# Altium schematic symbol library jlcpcb_2025_04_resistors_extended_2512.schlib: 2667 symbols (part 11 of 14) (continued)
## RMC1-200JTE
designator R?  Resistance: 20Ω  (hidden comment: *)
Resistor, 20Ω, ±5%, 1W, 200V, ±200ppm/℃, -55℃~+155℃, SMD 2512; Manufacturer: Uniroyal; Manufacturer Part Number: RMC1-200JTE; Supplier 1: LCSC; Supplier Part Number 1: C909340; JLCPCB Part Number: C909340; Power Rating: 1W; Category: Resistors; Package Size: 2512; JLCPCB Basic Part: Yes; Tolerance: ±5%; Voltage Rating: 200V; Temperature Coefficient: ±200ppm/℃; Temperature Rating: -55℃~+155℃; ComponentLink1Description: Datasheet; ComponentLink1URL: https://wmsc.lcsc.com/wmsc/upload/file/pdf/v2/lcsc/2109151530_KAMAYA-RMC1-200JTE_C909340.pdf; ComponentLink2Description: JLCPCB Part URL; ComponentLink2URL: https://jlcpcb.com/partdetail/C909340
pins: 1, 2
1 alternate drawing of the same symbol

## RMC1-331JTE
designator R?  Resistance: 330Ω  (hidden comment: *)
Resistor, 330Ω, ±5%, 1W, ±200ppm/℃, SMD 2512; Manufacturer: Uniroyal; Manufacturer Part Number: RMC1-331JTE; Supplier 1: LCSC; Supplier Part Number 1: C323618; JLCPCB Part Number: C323618; Power Rating: 1W; Category: Resistors; Package Size: 2512; JLCPCB Basic Part: Yes; Tolerance: ±5%; Temperature Coefficient: ±200ppm/℃; ComponentLink1Description: Datasheet; ComponentLink1URL: https://wmsc.lcsc.com/wmsc/upload/file/pdf/v2/lcsc/2304140030_KAMAYA-RMC1-331JTE_C323618.pdf; ComponentLink2Description: JLCPCB Part URL; ComponentLink2URL: https://jlcpcb.com/partdetail/C323618
pins: 1, 2
1 alternate drawing of the same symbol

## RMC1-390JTE
designator R?  Resistance: 39Ω  (hidden comment: *)
Resistor, 39Ω, ±5%, 1W, ±200ppm/℃, -55℃~+155℃, SMD 2512; Manufacturer: Uniroyal; Manufacturer Part Number: RMC1-390JTE; Supplier 1: LCSC; Supplier Part Number 1: C323616; JLCPCB Part Number: C323616; Power Rating: 1W; Category: Resistors; Package Size: 2512; JLCPCB Basic Part: Yes; Tolerance: ±5%; Temperature Coefficient: ±200ppm/℃; Temperature Rating: -55℃~+155℃; ComponentLink1Description: Datasheet; ComponentLink1URL: https://wmsc.lcsc.com/wmsc/upload/file/pdf/v2/lcsc/2304140030_KAMAYA-RMC1-390JTE_C323616.pdf; ComponentLink2Description: JLCPCB Part URL; ComponentLink2URL: https://jlcpcb.com/partdetail/C323616
pins: 1, 2
1 alternate drawing of the same symbol

## RMC1-472JTE-M
designator R?  Resistance: 4.7kΩ  (hidden comment: *)
Resistor, 4.7kΩ, ±5%, 1W, ±200ppm/℃, SMD 2512; Manufacturer: Uniroyal; Manufacturer Part Number: RMC1-472JTE-M; Supplier 1: LCSC; Supplier Part Number 1: C340480; JLCPCB Part Number: C340480; Power Rating: 1W; Category: Resistors; Package Size: 2512; JLCPCB Basic Part: Yes; Tolerance: ±5%; Temperature Coefficient: ±200ppm/℃; ComponentLink1Description: Datasheet; ComponentLink1URL: https://wmsc.lcsc.com/wmsc/upload/file/pdf/v2/lcsc/2304140030_KAMAYA-RMC1-472JTE-M_C340480.pdf; ComponentLink2Description: JLCPCB Part URL; ComponentLink2URL: https://jlcpcb.com/partdetail/C340480
pins: 1, 2
1 alternate drawing of the same symbol

## RMC1K100FTE-M
designator R?  Resistance: 10Ω  (hidden comment: *)
Resistor, 10Ω, ±1%, 1W, ±100ppm/℃, SMD 2512; Manufacturer: Uniroyal; Manufacturer Part Number: RMC1K100FTE-M; Supplier 1: LCSC; Supplier Part Number 1: C340513; JLCPCB Part Number: C340513; Power Rating: 1W; Category: Resistors; Package Size: 2512; JLCPCB Basic Part: Yes; Tolerance: ±1%; Temperature Coefficient: ±100ppm/℃; ComponentLink1Description: Datasheet; ComponentLink1URL: https://wmsc.lcsc.com/wmsc/upload/file/pdf/v2/lcsc/2304140030_KAMAYA-RMC1K100FTE-M_C340513.pdf; ComponentLink2Description: JLCPCB Part URL; ComponentLink2URL: https://jlcpcb.com/partdetail/C340513
pins: 1, 2
1 alternate drawing of the same symbol

## RMC25121K1_N
designator R?  Resistance: 1kΩ  (hidden comment: *)
Resistor, 1kΩ, ±1%, 1W, SMD 2512; Manufacturer: Uniroyal; Manufacturer Part Number: RMC25121K1%N; Supplier 1: LCSC; Supplier Part Number 1: C269365; JLCPCB Part Number: C269365; Power Rating: 1W; Category: Resistors; Package Size: 2512; JLCPCB Basic Part: Yes; Tolerance: ±1%; ComponentLink1Description: Datasheet; ComponentLink1URL: https://wmsc.lcsc.com/wmsc/upload/file/pdf/v2/lcsc/2304140030_TyoHM-RMC25121K1-N_C269365.pdf; ComponentLink2Description: JLCPCB Part URL; ComponentLink2URL: https://jlcpcb.com/partdetail/C269365
pins: 1, 2
1 alternate drawing of the same symbol

## RMC25121K5_N
designator R?  Resistance: 1kΩ  (hidden comment: *)
Resistor, 1kΩ, ±5%, 1W, SMD 2512; Manufacturer: Uniroyal; Manufacturer Part Number: RMC25121K5%N; Supplier 1: LCSC; Supplier Part Number 1: C269349; JLCPCB Part Number: C269349; Power Rating: 1W; Category: Resistors; Package Size: 2512; JLCPCB Basic Part: Yes; Tolerance: ±5%; ComponentLink1Description: Datasheet; ComponentLink1URL: https://wmsc.lcsc.com/wmsc/upload/file/pdf/v2/lcsc/2304140030_TyoHM-RMC25121K5-N_C269349.pdf; ComponentLink2Description: JLCPCB Part URL; ComponentLink2URL: https://jlcpcb.com/partdetail/C269349
pins: 1, 2
1 alternate drawing of the same symbol

## RMC25121M1_N
designator R?  Resistance: 1MΩ  (hidden comment: *)
Resistor, 1MΩ, ±1%, 1W, SMD 2512; Manufacturer: Uniroyal; Manufacturer Part Number: RMC25121M1%N; Supplier 1: LCSC; Supplier Part Number 1: C269888; JLCPCB Part Number: C269888; Power Rating: 1W; Category: Resistors; Package Size: 2512; JLCPCB Basic Part: Yes; Tolerance: ±1%; ComponentLink1Description: Datasheet; ComponentLink1URL: https://wmsc.lcsc.com/wmsc/upload/file/pdf/v2/lcsc/2304140030_TyoHM-RMC25121M1-N_C269888.pdf; ComponentLink2Description: JLCPCB Part URL; ComponentLink2URL: https://jlcpcb.com/partdetail/C269888
pins: 1, 2
1 alternate drawing of the same symbol

## RMC25122_21_N
designator R?  Resistance: 2.2Ω  (hidden comment: *)
Resistor, 2.2Ω, ±1%, 1W, SMD 2512; Manufacturer: Uniroyal; Manufacturer Part Number: RMC25122.21%N; Supplier 1: LCSC; Supplier Part Number 1: C269371; JLCPCB Part Number: C269371; Power Rating: 1W; Category: Resistors; Package Size: 2512; JLCPCB Basic Part: Yes; Tolerance: ±1%; ComponentLink1Description: Datasheet; ComponentLink1URL: https://wmsc.lcsc.com/wmsc/upload/file/pdf/v2/lcsc/2304140030_TyoHM-RMC25122-21-N_C269371.pdf; ComponentLink2Description: JLCPCB Part URL; ComponentLink2URL: https://jlcpcb.com/partdetail/C269371
pins: 1, 2
1 alternate drawing of the same symbol

## RMC25122_25_N
designator R?  Resistance: 2.2Ω  (hidden comment: *)
Resistor, 2.2Ω, ±5%, 1W, SMD 2512; Manufacturer: Uniroyal; Manufacturer Part Number: RMC25122.25%N; Supplier 1: LCSC; Supplier Part Number 1: C269350; JLCPCB Part Number: C269350; Power Rating: 1W; Category: Resistors; Package Size: 2512; JLCPCB Basic Part: Yes; Tolerance: ±5%; ComponentLink1Description: Datasheet; ComponentLink1URL: https://wmsc.lcsc.com/wmsc/upload/file/pdf/v2/lcsc/2304140030_TyoHM-RMC25122-25-N_C269350.pdf; ComponentLink2Description: JLCPCB Part URL; ComponentLink2URL: https://jlcpcb.com/partdetail/C269350
pins: 1, 2
1 alternate drawing of the same symbol

## RMC25124_7K1_N
designator R?  Resistance: 4.7kΩ  (hidden comment: *)
Resistor, 4.7kΩ, ±1%, 1W, SMD 2512; Manufacturer: Uniroyal; Manufacturer Part Number: RMC25124.7K1%N; Supplier 1: LCSC; Supplier Part Number 1: C269368; JLCPCB Part Number: C269368; Power Rating: 1W; Category: Resistors; Package Size: 2512; JLCPCB Basic Part: Yes; Tolerance: ±1%; ComponentLink1Description: Datasheet; ComponentLink1URL: https://wmsc.lcsc.com/wmsc/upload/file/pdf/v2/lcsc/2304140030_TyoHM-RMC25124-7K1-N_C269368.pdf; ComponentLink2Description: JLCPCB Part URL; ComponentLink2URL: https://jlcpcb.com/partdetail/C269368
pins: 1, 2
1 alternate drawing of the same symbol

## RMC251205_N
designator R?  Resistance: 0Ω  (hidden comment: *)
Resistor, 0Ω, ±5%, 1W, SMD 2512; Manufacturer: Uniroyal; Manufacturer Part Number: RMC251205%N; Supplier 1: LCSC; Supplier Part Number 1: C269343; JLCPCB Part Number: C269343; Power Rating: 1W; Category: Resistors; Package Size: 2512; JLCPCB Basic Part: Yes; Tolerance: ±5%; ComponentLink1Description: Datasheet; ComponentLink1URL: https://wmsc.lcsc.com/wmsc/upload/file/pdf/v2/lcsc/2304140030_TyoHM-RMC251205-N_C269343.pdf; ComponentLink2Description: JLCPCB Part URL; ComponentLink2URL: https://jlcpcb.com/partdetail/C269343
pins: 1, 2
1 alternate drawing of the same symbol

## RMC251211_N
designator R?  Resistance: 1Ω  (hidden comment: *)
Resistor, 1Ω, ±1%, 1W, SMD 2512; Manufacturer: Uniroyal; Manufacturer Part Number: RMC251211%N; Supplier 1: LCSC; Supplier Part Number 1: C269370; JLCPCB Part Number: C269370; Power Rating: 1W; Category: Resistors; Package Size: 2512; JLCPCB Basic Part: Yes; Tolerance: ±1%; ComponentLink1Description: Datasheet; ComponentLink1URL: https://wmsc.lcsc.com/wmsc/upload/file/pdf/v2/lcsc/2304140030_TyoHM-RMC251211-N_C269370.pdf; ComponentLink2Description: JLCPCB Part URL; ComponentLink2URL: https://jlcpcb.com/partdetail/C269370
pins: 1, 2
1 alternate drawing of the same symbol

## RMC251220K5_N
designator R?  Resistance: 20kΩ  (hidden comment: *)
Resistor, 20kΩ, ±5%, 1W, SMD 2512; Manufacturer: Uniroyal; Manufacturer Part Number: RMC251220K5%N; Supplier 1: LCSC; Supplier Part Number 1: C269353; JLCPCB Part Number: C269353; Power Rating: 1W; Category: Resistors; Package Size: 2512; JLCPCB Basic Part: Yes; Tolerance: ±5%; ComponentLink1Description: Datasheet; ComponentLink1URL: https://wmsc.lcsc.com/wmsc/upload/file/pdf/v2/lcsc/2304140030_TyoHM-RMC251220K5-N_C269353.pdf; ComponentLink2Description: JLCPCB Part URL; ComponentLink2URL: https://jlcpcb.com/partdetail/C269353
pins: 1, 2
1 alternate drawing of the same symbol

## RMC251247K5_N
designator R?  Resistance: 47kΩ  (hidden comment: *)
Resistor, 47kΩ, ±5%, 1W, SMD 2512; Manufacturer: Uniroyal; Manufacturer Part Number: RMC251247K5%N; Supplier 1: LCSC; Supplier Part Number 1: C269358; JLCPCB Part Number: C269358; Power Rating: 1W; Category: Resistors; Package Size: 2512; JLCPCB Basic Part: Yes; Tolerance: ±5%; ComponentLink1Description: Datasheet; ComponentLink1URL: https://wmsc.lcsc.com/wmsc/upload/file/pdf/v2/lcsc/2304140030_TyoHM-RMC251247K5-N_C269358.pdf; ComponentLink2Description: JLCPCB Part URL; ComponentLink2URL: https://jlcpcb.com/partdetail/C269358
pins: 1, 2
1 alternate drawing of the same symbol

## RMC251256K1_N
designator R?  Resistance: 56kΩ  (hidden comment: *)
Resistor, 56kΩ, ±1%, 1W, SMD 2512; Manufacturer: Uniroyal; Manufacturer Part Number: RMC251256K1%N; Supplier 1: LCSC; Supplier Part Number 1: C269369; JLCPCB Part Number: C269369; Power Rating: 1W; Category: Resistors; Package Size: 2512; JLCPCB Basic Part: Yes; Tolerance: ±1%; ComponentLink1Description: Datasheet; ComponentLink1URL: https://wmsc.lcsc.com/wmsc/upload/file/pdf/v2/lcsc/2304140030_TyoHM-RMC251256K1-N_C269369.pdf; ComponentLink2Description: JLCPCB Part URL; ComponentLink2URL: https://jlcpcb.com/partdetail/C269369
pins: 1, 2
1 alternate drawing of the same symbol

## RMC2512105_N
designator R?  Resistance: 10Ω  (hidden comment: *)
Resistor, 10Ω, ±5%, 1W, SMD 2512; Manufacturer: Uniroyal; Manufacturer Part Number: RMC2512105%N; Supplier 1: LCSC; Supplier Part Number 1: C269345; JLCPCB Part Number: C269345; Power Rating: 1W; Category: Resistors; Package Size: 2512; JLCPCB Basic Part: Yes; Tolerance: ±5%; ComponentLink1Description: Datasheet; ComponentLink1URL: https://wmsc.lcsc.com/wmsc/upload/file/pdf/v2/lcsc/2304140030_TyoHM-RMC2512105-N_C269345.pdf; ComponentLink2Description: JLCPCB Part URL; ComponentLink2URL: https://jlcpcb.com/partdetail/C269345
pins: 1, 2
1 alternate drawing of the same symbol

## RMC2512240K5_N
designator R?  Resistance: 240kΩ  (hidden comment: *)
Resistor, 240kΩ, ±5%, 1W, SMD 2512; Manufacturer: Uniroyal; Manufacturer Part Number: RMC2512240K5%N; Supplier 1: LCSC; Supplier Part Number 1: C269355; JLCPCB Part Number: C269355; Power Rating: 1W; Category: Resistors; Package Size: 2512; JLCPCB Basic Part: Yes; Tolerance: ±5%; ComponentLink1Description: Datasheet; ComponentLink1URL: https://wmsc.lcsc.com/wmsc/upload/file/pdf/v2/lcsc/2304140030_TyoHM-RMC2512240K5-N_C269355.pdf; ComponentLink2Description: JLCPCB Part URL; ComponentLink2URL: https://jlcpcb.com/partdetail/C269355
pins: 1, 2
1 alternate drawing of the same symbol

## RMC2512300K1_N
designator R?  Resistance: 300kΩ  (hidden comment: *)
Resistor, 300kΩ, ±1%, 1W, SMD 2512; Manufacturer: Uniroyal; Manufacturer Part Number: RMC2512300K1%N; Supplier 1: LCSC; Supplier Part Number 1: C269366; JLCPCB Part Number: C269366; Power Rating: 1W; Category: Resistors; Package Size: 2512; JLCPCB Basic Part: Yes; Tolerance: ±1%; ComponentLink1Description: Datasheet; ComponentLink1URL: https://wmsc.lcsc.com/wmsc/upload/file/pdf/v2/lcsc/2304140030_TyoHM-RMC2512300K1-N_C269366.pdf; ComponentLink2Description: JLCPCB Part URL; ComponentLink2URL: https://jlcpcb.com/partdetail/C269366
pins: 1, 2
1 alternate drawing of the same symbol

## RMC2512365_N
designator R?  Resistance: 36Ω  (hidden comment: *)
Resistor, 36Ω, ±5%, 1W, SMD 2512; Manufacturer: Uniroyal; Manufacturer Part Number: RMC2512365%N; Supplier 1: LCSC; Supplier Part Number 1: C269357; JLCPCB Part Number: C269357; Power Rating: 1W; Category: Resistors; Package Size: 2512; JLCPCB Basic Part: Yes; Tolerance: ±5%; ComponentLink1Description: Datasheet; ComponentLink1URL: https://wmsc.lcsc.com/wmsc/upload/file/pdf/v2/lcsc/2304140030_TyoHM-RMC2512365-N_C269357.pdf; ComponentLink2Description: JLCPCB Part URL; ComponentLink2URL: https://jlcpcb.com/partdetail/C269357
pins: 1, 2
1 alternate drawing of the same symbol

## RMC2512475_N
designator R?  Resistance: 47Ω  (hidden comment: *)
Resistor, 47Ω, ±5%, 1W, SMD 2512; Manufacturer: Uniroyal; Manufacturer Part Number: RMC2512475%N; Supplier 1: LCSC; Supplier Part Number 1: C269359; JLCPCB Part Number: C269359; Power Rating: 1W; Category: Resistors; Package Size: 2512; JLCPCB Basic Part: Yes; Tolerance: ±5%; ComponentLink1Description: Datasheet; ComponentLink1URL: https://wmsc.lcsc.com/wmsc/upload/file/pdf/v2/lcsc/2304140030_TyoHM-RMC2512475-N_C269359.pdf; ComponentLink2Description: JLCPCB Part URL; ComponentLink2URL: https://jlcpcb.com/partdetail/C269359
pins: 1, 2
1 alternate drawing of the same symbol

## RMC2512510K5_N
designator R?  Resistance: 510kΩ  (hidden comment: *)
Resistor, 510kΩ, ±5%, 1W, SMD 2512; Manufacturer: Uniroyal; Manufacturer Part Number: RMC2512510K5%N; Supplier 1: LCSC; Supplier Part Number 1: C269360; JLCPCB Part Number: C269360; Power Rating: 1W; Category: Resistors; Package Size: 2512; JLCPCB Basic Part: Yes; Tolerance: ±5%; ComponentLink1Description: Datasheet; ComponentLink1URL: https://wmsc.lcsc.com/wmsc/upload/file/pdf/v2/lcsc/2304140030_TyoHM-RMC2512510K5-N_C269360.pdf; ComponentLink2Description: JLCPCB Part URL; ComponentLink2URL: https://jlcpcb.com/partdetail/C269360
pins: 1, 2
1 alternate drawing of the same symbol

## RMC25121001_N
designator R?  Resistance: 100Ω  (hidden comment: *)
Resistor, 100Ω, ±1%, 1W, SMD 2512; Manufacturer: Uniroyal; Manufacturer Part Number: RMC25121001%N; Supplier 1: LCSC; Supplier Part Number 1: C325952; JLCPCB Part Number: C325952; Power Rating: 1W; Category: Resistors; Package Size: 2512; JLCPCB Basic Part: Yes; Tolerance: ±1%; ComponentLink1Description: Datasheet; ComponentLink1URL: https://wmsc.lcsc.com/wmsc/upload/file/pdf/v2/lcsc/2304140030_TyoHM-RMC25121001-N_C325952.pdf; ComponentLink2Description: JLCPCB Part URL; ComponentLink2URL: https://jlcpcb.com/partdetail/C325952
pins: 1, 2
1 alternate drawing of the same symbol

## RMC25121005_N
designator R?  Resistance: 100Ω  (hidden comment: *)
Resistor, 100Ω, ±5%, 1W, SMD 2512; Manufacturer: Uniroyal; Manufacturer Part Number: RMC25121005%N; Supplier 1: LCSC; Supplier Part Number 1: C269344; JLCPCB Part Number: C269344; Power Rating: 1W; Category: Resistors; Package Size: 2512; JLCPCB Basic Part: Yes; Tolerance: ±5%; ComponentLink1Description: Datasheet; ComponentLink1URL: https://wmsc.lcsc.com/wmsc/upload/file/pdf/v2/lcsc/2304140030_TyoHM-RMC25121005-N_C269344.pdf; ComponentLink2Description: JLCPCB Part URL; ComponentLink2URL: https://jlcpcb.com/partdetail/C269344
pins: 1, 2
1 alternate drawing of the same symbol

## RMC25121505_N
designator R?  Resistance: 150Ω  (hidden comment: *)
Resistor, 150Ω, ±5%, 1W, SMD 2512; Manufacturer: Uniroyal; Manufacturer Part Number: RMC25121505%N; Supplier 1: LCSC; Supplier Part Number 1: C269348; JLCPCB Part Number: C269348; Power Rating: 1W; Category: Resistors; Package Size: 2512; JLCPCB Basic Part: Yes; Tolerance: ±5%; ComponentLink1Description: Datasheet; ComponentLink1URL: https://wmsc.lcsc.com/wmsc/upload/file/pdf/v2/lcsc/2304140030_TyoHM-RMC25121505-N_C269348.pdf; ComponentLink2Description: JLCPCB Part URL; ComponentLink2URL: https://jlcpcb.com/partdetail/C269348
pins: 1, 2
1 alternate drawing of the same symbol

## RMC25122005_N
designator R?  Resistance: 200Ω  (hidden comment: *)
Resistor, 200Ω, ±5%, 1W, SMD 2512; Manufacturer: Uniroyal; Manufacturer Part Number: RMC25122005%N; Supplier 1: LCSC; Supplier Part Number 1: C269352; JLCPCB Part Number: C269352; Power Rating: 1W; Category: Resistors; Package Size: 2512; JLCPCB Basic Part: Yes; Tolerance: ±5%; ComponentLink1Description: Datasheet; ComponentLink1URL: https://wmsc.lcsc.com/wmsc/upload/file/pdf/v2/lcsc/2304140030_TyoHM-RMC25122005-N_C269352.pdf; ComponentLink2Description: JLCPCB Part URL; ComponentLink2URL: https://jlcpcb.com/partdetail/C269352
pins: 1, 2
1 alternate drawing of the same symbol

## RMC25122205_N
designator R?  Resistance: 220Ω  (hidden comment: *)
Resistor, 220Ω, ±5%, 1W, SMD 2512; Manufacturer: Uniroyal; Manufacturer Part Number: RMC25122205%N; Supplier 1: LCSC; Supplier Part Number 1: C269354; JLCPCB Part Number: C269354; Power Rating: 1W; Category: Resistors; Package Size: 2512; JLCPCB Basic Part: Yes; Tolerance: ±5%; ComponentLink1Description: Datasheet; ComponentLink1URL: https://wmsc.lcsc.com/wmsc/upload/file/pdf/v2/lcsc/2304140030_TyoHM-RMC25122205-N_C269354.pdf; ComponentLink2Description: JLCPCB Part URL; ComponentLink2URL: https://jlcpcb.com/partdetail/C269354
pins: 1, 2
1 alternate drawing of the same symbol

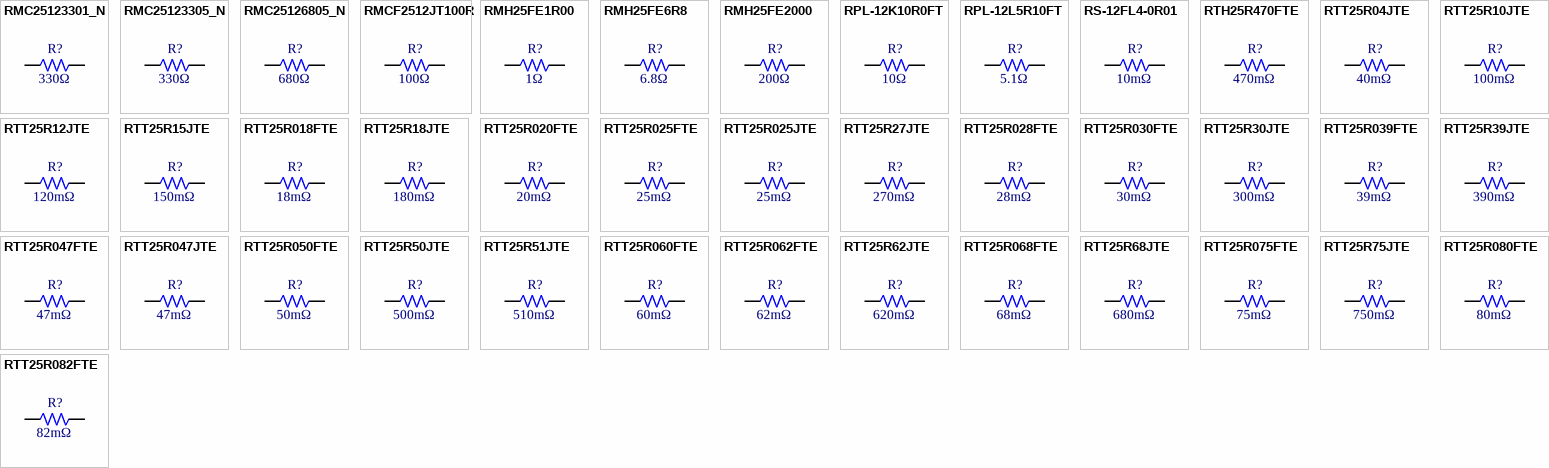
[diagram p53: symbols RMC25123301_N to RTT25R082FTE]

## RMC25123301_N
designator R?  Resistance: 330Ω  (hidden comment: *)
Resistor, 330Ω, ±1%, 1W, SMD 2512; Manufacturer: Uniroyal; Manufacturer Part Number: RMC25123301%N; Supplier 1: LCSC; Supplier Part Number 1: C269367; JLCPCB Part Number: C269367; Power Rating: 1W; Category: Resistors; Package Size: 2512; JLCPCB Basic Part: Yes; Tolerance: ±1%; ComponentLink1Description: Datasheet; ComponentLink1URL: https://wmsc.lcsc.com/wmsc/upload/file/pdf/v2/lcsc/2304140030_TyoHM-RMC25123301-N_C269367.pdf; ComponentLink2Description: JLCPCB Part URL; ComponentLink2URL: https://jlcpcb.com/partdetail/C269367
pins: 1, 2
1 alternate drawing of the same symbol

## RMC25123305_N
designator R?  Resistance: 330Ω  (hidden comment: *)
Resistor, 330Ω, ±5%, 1W, SMD 2512; Manufacturer: Uniroyal; Manufacturer Part Number: RMC25123305%N; Supplier 1: LCSC; Supplier Part Number 1: C269356; JLCPCB Part Number: C269356; Power Rating: 1W; Category: Resistors; Package Size: 2512; JLCPCB Basic Part: Yes; Tolerance: ±5%; ComponentLink1Description: Datasheet; ComponentLink1URL: https://wmsc.lcsc.com/wmsc/upload/file/pdf/v2/lcsc/2304140030_TyoHM-RMC25123305-N_C269356.pdf; ComponentLink2Description: JLCPCB Part URL; ComponentLink2URL: https://jlcpcb.com/partdetail/C269356
pins: 1, 2
1 alternate drawing of the same symbol

## RMC25126805_N
designator R?  Resistance: 680Ω  (hidden comment: *)
Resistor, 680Ω, ±5%, 1W, SMD 2512; Manufacturer: Uniroyal; Manufacturer Part Number: RMC25126805%N; Supplier 1: LCSC; Supplier Part Number 1: C269363; JLCPCB Part Number: C269363; Power Rating: 1W; Category: Resistors; Package Size: 2512; JLCPCB Basic Part: Yes; Tolerance: ±5%; ComponentLink1Description: Datasheet; ComponentLink1URL: https://wmsc.lcsc.com/wmsc/upload/file/pdf/v2/lcsc/2304140030_TyoHM-RMC25126805-N_C269363.pdf; ComponentLink2Description: JLCPCB Part URL; ComponentLink2URL: https://jlcpcb.com/partdetail/C269363
pins: 1, 2
1 alternate drawing of the same symbol

## RMCF2512JT100R
designator R?  Resistance: 100Ω  (hidden comment: *)
Resistor, 100Ω, ±5%, 1W, 200V, ±200ppm/℃, -55℃~+155℃, SMD 2512; Manufacturer: Uniroyal; Manufacturer Part Number: RMCF2512JT100R; Supplier 1: LCSC; Supplier Part Number 1: C2441438; JLCPCB Part Number: C2441438; Power Rating: 1W; Category: Resistors; Package Size: 2512; JLCPCB Basic Part: Yes; Tolerance: ±5%; Voltage Rating: 200V; Temperature Coefficient: ±200ppm/℃; Temperature Rating: -55℃~+155℃; ComponentLink1Description: Datasheet; ComponentLink1URL: https://wmsc.lcsc.com/wmsc/upload/file/pdf/v2/lcsc/2304140030_SEI-Stackpole-Elec-RMCF2512JT100R_C2441438.pdf; ComponentLink2Description: JLCPCB Part URL; ComponentLink2URL: https://jlcpcb.com/partdetail/C2441438
pins: 1, 2
1 alternate drawing of the same symbol

## RMH25FE1R00
designator R?  Resistance: 1Ω  (hidden comment: *)
Resistor, 1Ω, ±1%, 2W, 200V, ±400ppm/℃, -55℃~+155℃, SMD 2512; Manufacturer: Uniroyal; Manufacturer Part Number: RMH25FE1R00; Supplier 1: LCSC; Supplier Part Number 1: C2941595; JLCPCB Part Number: C2941595; Power Rating: 2W; Category: Resistors; Package Size: 2512; JLCPCB Basic Part: Yes; Tolerance: ±1%; Voltage Rating: 200V; Temperature Coefficient: ±400ppm/℃; Temperature Rating: -55℃~+155℃; ComponentLink1Description: Datasheet; ComponentLink1URL: https://wmsc.lcsc.com/wmsc/upload/file/pdf/v2/lcsc/2201121900_TA-I-Tech-RMH25FE1R00_C2941595.pdf; ComponentLink2Description: JLCPCB Part URL; ComponentLink2URL: https://jlcpcb.com/partdetail/C2941595
pins: 1, 2
1 alternate drawing of the same symbol

## RMH25FE6R8
designator R?  Resistance: 6.8Ω  (hidden comment: *)
Resistor, 6.8Ω, ±1%, 2W, 200V, ±400ppm/℃, -55℃~+155℃, SMD 2512; Manufacturer: Uniroyal; Manufacturer Part Number: RMH25FE6R8; Supplier 1: LCSC; Supplier Part Number 1: C2941596; JLCPCB Part Number: C2941596; Power Rating: 2W; Category: Resistors; Package Size: 2512; JLCPCB Basic Part: Yes; Tolerance: ±1%; Voltage Rating: 200V; Temperature Coefficient: ±400ppm/℃; Temperature Rating: -55℃~+155℃; ComponentLink1Description: Datasheet; ComponentLink1URL: https://wmsc.lcsc.com/wmsc/upload/file/pdf/v2/lcsc/2201121900_TA-I-Tech-RMH25FE6R8_C2941596.pdf; ComponentLink2Description: JLCPCB Part URL; ComponentLink2URL: https://jlcpcb.com/partdetail/C2941596
pins: 1, 2
1 alternate drawing of the same symbol

## RMH25FE2000
designator R?  Resistance: 200Ω  (hidden comment: *)
Resistor, 200Ω, ±1%, 2W, 200V, ±100ppm/℃, -55℃~+155℃, SMD 2512; Manufacturer: Uniroyal; Manufacturer Part Number: RMH25FE2000; Supplier 1: LCSC; Supplier Part Number 1: C2941599; JLCPCB Part Number: C2941599; Power Rating: 2W; Category: Resistors; Package Size: 2512; JLCPCB Basic Part: Yes; Tolerance: ±1%; Voltage Rating: 200V; Temperature Coefficient: ±100ppm/℃; Temperature Rating: -55℃~+155℃; ComponentLink1Description: Datasheet; ComponentLink1URL: https://wmsc.lcsc.com/wmsc/upload/file/pdf/v2/lcsc/2201121900_TA-I-Tech-RMH25FE2000_C2941599.pdf; ComponentLink2Description: JLCPCB Part URL; ComponentLink2URL: https://jlcpcb.com/partdetail/C2941599
pins: 1, 2
1 alternate drawing of the same symbol

## RPL-12K10R0FT
designator R?  Resistance: 10Ω  (hidden comment: *)
Resistor, 10Ω, ±1%, 2W, ±100ppm/℃, -55℃~+155℃, SMD 2512; Manufacturer: Uniroyal; Manufacturer Part Number: RPL-12K10R0FT; Supplier 1: LCSC; Supplier Part Number 1: C2991665; JLCPCB Part Number: C2991665; Power Rating: 2W; Category: Resistors; Package Size: 2512; JLCPCB Basic Part: Yes; Tolerance: ±1%; Temperature Coefficient: ±100ppm/℃; Temperature Rating: -55℃~+155℃; ComponentLink1Description: Datasheet; ComponentLink1URL: https://wmsc.lcsc.com/wmsc/upload/file/pdf/v2/lcsc/2204111630_FH--Guangdong-Fenghua-Advanced-Tech-RPL-12K10R0FT_C2991665.pdf; ComponentLink2Description: JLCPCB Part URL; ComponentLink2URL: https://jlcpcb.com/partdetail/C2991665
pins: 1, 2
1 alternate drawing of the same symbol

## RPL-12L5R10FT
designator R?  Resistance: 5.1Ω  (hidden comment: *)
Resistor, 5.1Ω, ±1%, 2W, ±250ppm/℃, SMD 2512; Manufacturer: Uniroyal; Manufacturer Part Number: RPL-12L5R10FT; Supplier 1: LCSC; Supplier Part Number 1: C5119989; JLCPCB Part Number: C5119989; Power Rating: 2W; Category: Resistors; Package Size: 2512; JLCPCB Basic Part: Yes; Tolerance: ±1%; Temperature Coefficient: ±250ppm/℃; ComponentLink1Description: Datasheet; ComponentLink1URL: https://wmsc.lcsc.com/wmsc/upload/file/pdf/v2/lcsc/2207251030_FH--Guangdong-Fenghua-Advanced-Tech-RPL-12L5R10FT_C5119989.pdf; ComponentLink2Description: JLCPCB Part URL; ComponentLink2URL: https://jlcpcb.com/partdetail/C5119989
pins: 1, 2
1 alternate drawing of the same symbol

## RS-12FL4-0R01
designator R?  Resistance: 10mΩ  (hidden comment: *)
Resistor, 10mΩ, ±1%, SMD 2512; Manufacturer: Uniroyal; Manufacturer Part Number: RS-12FL4-0R01; Supplier 1: LCSC; Supplier Part Number 1: C2920591; JLCPCB Part Number: C2920591; Category: Resistors; Package Size: 2512; JLCPCB Basic Part: Yes; Tolerance: ±1%; ComponentLink1Description: Datasheet; ComponentLink1URL: https://wmsc.lcsc.com/wmsc/upload/file/pdf/v2/lcsc/2111152030_Viking-Tech-RS-12FL4-0R01_C2920591.pdf; ComponentLink2Description: JLCPCB Part URL; ComponentLink2URL: https://jlcpcb.com/partdetail/C2920591
pins: 1, 2
1 alternate drawing of the same symbol

## RTH25R470FTE
designator R?  Resistance: 470mΩ  (hidden comment: *)
Resistor, 470mΩ, ±1%, 2W, 200V, ±100ppm/℃, -55℃~+155℃, SMD 2512; Manufacturer: Uniroyal; Manufacturer Part Number: RTH25R470FTE; Supplier 1: LCSC; Supplier Part Number 1: C2991287; JLCPCB Part Number: C2991287; Power Rating: 2W; Category: Resistors; Package Size: 2512; JLCPCB Basic Part: Yes; Tolerance: ±1%; Voltage Rating: 200V; Temperature Coefficient: ±100ppm/℃; Temperature Rating: -55℃~+155℃; ComponentLink1Description: Datasheet; ComponentLink1URL: https://wmsc.lcsc.com/wmsc/upload/file/pdf/v2/lcsc/2204082030_RALEC-RTH25R470FTE_C2991287.pdf; ComponentLink2Description: JLCPCB Part URL; ComponentLink2URL: https://jlcpcb.com/partdetail/C2991287
pins: 1, 2
1 alternate drawing of the same symbol

## RTT25R04JTE
designator R?  Resistance: 40mΩ  (hidden comment: *)
Resistor, 40mΩ, ±5%, 1W, 200V, ±900ppm/℃, -55℃~+155℃, SMD 2512; Manufacturer: Uniroyal; Manufacturer Part Number: RTT25R04JTE; Supplier 1: LCSC; Supplier Part Number 1: C159169; JLCPCB Part Number: C159169; Power Rating: 1W; Category: Resistors; Package Size: 2512; JLCPCB Basic Part: Yes; Tolerance: ±5%; Voltage Rating: 200V; Temperature Coefficient: ±900ppm/℃; Temperature Rating: -55℃~+155℃; ComponentLink1Description: Datasheet; ComponentLink1URL: https://wmsc.lcsc.com/wmsc/upload/file/pdf/v2/lcsc/2304140030_RALEC-RTT25R04JTE_C159169.pdf; ComponentLink2Description: JLCPCB Part URL; ComponentLink2URL: https://jlcpcb.com/partdetail/C159169
pins: 1, 2
1 alternate drawing of the same symbol

## RTT25R10JTE
designator R?  Resistance: 100mΩ  (hidden comment: *)
Resistor, 100mΩ, ±5%, 1W, 200V, ±200ppm/℃, -55℃~+155℃, SMD 2512; Manufacturer: Uniroyal; Manufacturer Part Number: RTT25R10JTE; Supplier 1: LCSC; Supplier Part Number 1: C159168; JLCPCB Part Number: C159168; Power Rating: 1W; Category: Resistors; Package Size: 2512; JLCPCB Basic Part: Yes; Tolerance: ±5%; Voltage Rating: 200V; Temperature Coefficient: ±200ppm/℃; Temperature Rating: -55℃~+155℃; ComponentLink1Description: Datasheet; ComponentLink1URL: https://wmsc.lcsc.com/wmsc/upload/file/pdf/v2/lcsc/2304140030_RALEC-RTT25R10JTE_C159168.pdf; ComponentLink2Description: JLCPCB Part URL; ComponentLink2URL: https://jlcpcb.com/partdetail/C159168
pins: 1, 2
1 alternate drawing of the same symbol

## RTT25R12JTE
designator R?  Resistance: 120mΩ  (hidden comment: *)
Resistor, 120mΩ, ±5%, 1W, 200V, ±200ppm/℃, -55℃~+155℃, SMD 2512; Manufacturer: Uniroyal; Manufacturer Part Number: RTT25R12JTE; Supplier 1: LCSC; Supplier Part Number 1: C159167; JLCPCB Part Number: C159167; Power Rating: 1W; Category: Resistors; Package Size: 2512; JLCPCB Basic Part: Yes; Tolerance: ±5%; Voltage Rating: 200V; Temperature Coefficient: ±200ppm/℃; Temperature Rating: -55℃~+155℃; ComponentLink1Description: Datasheet; ComponentLink1URL: https://wmsc.lcsc.com/wmsc/upload/file/pdf/v2/lcsc/2304140030_RALEC-RTT25R12JTE_C159167.pdf; ComponentLink2Description: JLCPCB Part URL; ComponentLink2URL: https://jlcpcb.com/partdetail/C159167
pins: 1, 2
1 alternate drawing of the same symbol

## RTT25R15JTE
designator R?  Resistance: 150mΩ  (hidden comment: *)
Resistor, 150mΩ, ±5%, 1W, 200V, ±200ppm/℃, -55℃~+155℃, SMD 2512; Manufacturer: Uniroyal; Manufacturer Part Number: RTT25R15JTE; Supplier 1: LCSC; Supplier Part Number 1: C159166; JLCPCB Part Number: C159166; Power Rating: 1W; Category: Resistors; Package Size: 2512; JLCPCB Basic Part: Yes; Tolerance: ±5%; Voltage Rating: 200V; Temperature Coefficient: ±200ppm/℃; Temperature Rating: -55℃~+155℃; ComponentLink1Description: Datasheet; ComponentLink1URL: https://wmsc.lcsc.com/wmsc/upload/file/pdf/v2/lcsc/2304140030_RALEC-RTT25R15JTE_C159166.pdf; ComponentLink2Description: JLCPCB Part URL; ComponentLink2URL: https://jlcpcb.com/partdetail/C159166
pins: 1, 2
1 alternate drawing of the same symbol

## RTT25R018FTE
designator R?  Resistance: 18mΩ  (hidden comment: *)
Resistor, 18mΩ, ±1%, 1W, 200V, ±1500ppm/℃, -55℃~+155℃, SMD 2512; Manufacturer: Uniroyal; Manufacturer Part Number: RTT25R018FTE; Supplier 1: LCSC; Supplier Part Number 1: C333692; JLCPCB Part Number: C333692; Power Rating: 1W; Category: Resistors; Package Size: 2512; JLCPCB Basic Part: Yes; Tolerance: ±1%; Voltage Rating: 200V; Temperature Coefficient: ±1500ppm/℃; Temperature Rating: -55℃~+155℃; ComponentLink1Description: Datasheet; ComponentLink1URL: https://wmsc.lcsc.com/wmsc/upload/file/pdf/v2/lcsc/2304140030_RALEC-RTT25R018FTE_C333692.pdf; ComponentLink2Description: JLCPCB Part URL; ComponentLink2URL: https://jlcpcb.com/partdetail/C333692
pins: 1, 2
1 alternate drawing of the same symbol

## RTT25R18JTE
designator R?  Resistance: 180mΩ  (hidden comment: *)
Resistor, 180mΩ, ±5%, 1W, 200V, ±200ppm/℃, -55℃~+155℃, SMD 2512; Manufacturer: Uniroyal; Manufacturer Part Number: RTT25R18JTE; Supplier 1: LCSC; Supplier Part Number 1: C159165; JLCPCB Part Number: C159165; Power Rating: 1W; Category: Resistors; Package Size: 2512; JLCPCB Basic Part: Yes; Tolerance: ±5%; Voltage Rating: 200V; Temperature Coefficient: ±200ppm/℃; Temperature Rating: -55℃~+155℃; ComponentLink1Description: Datasheet; ComponentLink1URL: https://wmsc.lcsc.com/wmsc/upload/file/pdf/v2/lcsc/2304140030_RALEC-RTT25R18JTE_C159165.pdf; ComponentLink2Description: JLCPCB Part URL; ComponentLink2URL: https://jlcpcb.com/partdetail/C159165
pins: 1, 2
1 alternate drawing of the same symbol

## RTT25R020FTE
designator R?  Resistance: 20mΩ  (hidden comment: *)
Resistor, 20mΩ, ±1%, 1W, 200V, ±1200ppm/℃, -55℃~+155℃, SMD 2512; Manufacturer: Uniroyal; Manufacturer Part Number: RTT25R020FTE; Supplier 1: LCSC; Supplier Part Number 1: C159174; JLCPCB Part Number: C159174; Power Rating: 1W; Category: Resistors; Package Size: 2512; JLCPCB Basic Part: Yes; Tolerance: ±1%; Voltage Rating: 200V; Temperature Coefficient: ±1200ppm/℃; Temperature Rating: -55℃~+155℃; ComponentLink1Description: Datasheet; ComponentLink1URL: https://wmsc.lcsc.com/wmsc/upload/file/pdf/v2/lcsc/2304140030_RALEC-RTT25R020FTE_C159174.pdf; ComponentLink2Description: JLCPCB Part URL; ComponentLink2URL: https://jlcpcb.com/partdetail/C159174
pins: 1, 2
1 alternate drawing of the same symbol

## RTT25R025FTE
designator R?  Resistance: 25mΩ  (hidden comment: *)
Resistor, 25mΩ, ±1%, 1W, 200V, ±900ppm/℃, -55℃~+155℃, SMD 2512; Manufacturer: Uniroyal; Manufacturer Part Number: RTT25R025FTE; Supplier 1: LCSC; Supplier Part Number 1: C159173; JLCPCB Part Number: C159173; Power Rating: 1W; Category: Resistors; Package Size: 2512; JLCPCB Basic Part: Yes; Tolerance: ±1%; Voltage Rating: 200V; Temperature Coefficient: ±900ppm/℃; Temperature Rating: -55℃~+155℃; ComponentLink1Description: Datasheet; ComponentLink1URL: https://wmsc.lcsc.com/wmsc/upload/file/pdf/v2/lcsc/2304140030_RALEC-RTT25R025FTE_C159173.pdf; ComponentLink2Description: JLCPCB Part URL; ComponentLink2URL: https://jlcpcb.com/partdetail/C159173
pins: 1, 2
1 alternate drawing of the same symbol

## RTT25R025JTE
designator R?  Resistance: 25mΩ  (hidden comment: *)
Resistor, 25mΩ, ±5%, 1W, ±900ppm/℃, SMD 2512; Manufacturer: Uniroyal; Manufacturer Part Number: RTT25R025JTE; Supplier 1: LCSC; Supplier Part Number 1: C305113; JLCPCB Part Number: C305113; Power Rating: 1W; Category: Resistors; Package Size: 2512; JLCPCB Basic Part: Yes; Tolerance: ±5%; Temperature Coefficient: ±900ppm/℃; ComponentLink1Description: Datasheet; ComponentLink1URL: https://wmsc.lcsc.com/wmsc/upload/file/pdf/v2/lcsc/2304140030_RALEC-RTT25R025JTE_C305113.pdf; ComponentLink2Description: JLCPCB Part URL; ComponentLink2URL: https://jlcpcb.com/partdetail/C305113
pins: 1, 2
1 alternate drawing of the same symbol

## RTT25R27JTE
designator R?  Resistance: 270mΩ  (hidden comment: *)
Resistor, 270mΩ, ±5%, 1W, ±200ppm/℃, SMD 2512; Manufacturer: Uniroyal; Manufacturer Part Number: RTT25R27JTE; Supplier 1: LCSC; Supplier Part Number 1: C305118; JLCPCB Part Number: C305118; Power Rating: 1W; Category: Resistors; Package Size: 2512; JLCPCB Basic Part: Yes; Tolerance: ±5%; Temperature Coefficient: ±200ppm/℃; ComponentLink1Description: Datasheet; ComponentLink1URL: https://wmsc.lcsc.com/wmsc/upload/file/pdf/v2/lcsc/2304140030_RALEC-RTT25R27JTE_C305118.pdf; ComponentLink2Description: JLCPCB Part URL; ComponentLink2URL: https://jlcpcb.com/partdetail/C305118
pins: 1, 2
1 alternate drawing of the same symbol

## RTT25R028FTE
designator R?  Resistance: 28mΩ  (hidden comment: *)
Resistor, 28mΩ, ±1%, 1W, 200V, ±900ppm/℃, -55℃~+155℃, SMD 2512; Manufacturer: Uniroyal; Manufacturer Part Number: RTT25R028FTE; Supplier 1: LCSC; Supplier Part Number 1: C333697; JLCPCB Part Number: C333697; Power Rating: 1W; Category: Resistors; Package Size: 2512; JLCPCB Basic Part: Yes; Tolerance: ±1%; Voltage Rating: 200V; Temperature Coefficient: ±900ppm/℃; Temperature Rating: -55℃~+155℃; ComponentLink1Description: Datasheet; ComponentLink1URL: https://wmsc.lcsc.com/wmsc/upload/file/pdf/v2/lcsc/2304140030_RALEC-RTT25R028FTE_C333697.pdf; ComponentLink2Description: JLCPCB Part URL; ComponentLink2URL: https://jlcpcb.com/partdetail/C333697
pins: 1, 2
1 alternate drawing of the same symbol

## RTT25R030FTE
designator R?  Resistance: 30mΩ  (hidden comment: *)
Resistor, 30mΩ, ±1%, 1W, 200V, ±900ppm/℃, -55℃~+155℃, SMD 2512; Manufacturer: Uniroyal; Manufacturer Part Number: RTT25R030FTE; Supplier 1: LCSC; Supplier Part Number 1: C159172; JLCPCB Part Number: C159172; Power Rating: 1W; Category: Resistors; Package Size: 2512; JLCPCB Basic Part: Yes; Tolerance: ±1%; Voltage Rating: 200V; Temperature Coefficient: ±900ppm/℃; Temperature Rating: -55℃~+155℃; ComponentLink1Description: Datasheet; ComponentLink1URL: https://wmsc.lcsc.com/wmsc/upload/file/pdf/v2/lcsc/2304140030_RALEC-RTT25R030FTE_C159172.pdf; ComponentLink2Description: JLCPCB Part URL; ComponentLink2URL: https://jlcpcb.com/partdetail/C159172
pins: 1, 2
1 alternate drawing of the same symbol

## RTT25R30JTE
designator R?  Resistance: 300mΩ  (hidden comment: *)
Resistor, 300mΩ, ±5%, 1W, 200V, ±200ppm/℃, -55℃~+155℃, SMD 2512; Manufacturer: Uniroyal; Manufacturer Part Number: RTT25R30JTE; Supplier 1: LCSC; Supplier Part Number 1: C159161; JLCPCB Part Number: C159161; Power Rating: 1W; Category: Resistors; Package Size: 2512; JLCPCB Basic Part: Yes; Tolerance: ±5%; Voltage Rating: 200V; Temperature Coefficient: ±200ppm/℃; Temperature Rating: -55℃~+155℃; ComponentLink1Description: Datasheet; ComponentLink1URL: https://wmsc.lcsc.com/wmsc/upload/file/pdf/v2/lcsc/2304140030_RALEC-RTT25R30JTE_C159161.pdf; ComponentLink2Description: JLCPCB Part URL; ComponentLink2URL: https://jlcpcb.com/partdetail/C159161
pins: 1, 2
1 alternate drawing of the same symbol

## RTT25R039FTE
designator R?  Resistance: 39mΩ  (hidden comment: *)
Resistor, 39mΩ, ±1%, 1W, 200V, ±900ppm/℃, -55℃~+155℃, SMD 2512; Manufacturer: Uniroyal; Manufacturer Part Number: RTT25R039FTE; Supplier 1: LCSC; Supplier Part Number 1: C159171; JLCPCB Part Number: C159171; Power Rating: 1W; Category: Resistors; Package Size: 2512; JLCPCB Basic Part: Yes; Tolerance: ±1%; Voltage Rating: 200V; Temperature Coefficient: ±900ppm/℃; Temperature Rating: -55℃~+155℃; ComponentLink1Description: Datasheet; ComponentLink1URL: https://wmsc.lcsc.com/wmsc/upload/file/pdf/v2/lcsc/2304140030_RALEC-RTT25R039FTE_C159171.pdf; ComponentLink2Description: JLCPCB Part URL; ComponentLink2URL: https://jlcpcb.com/partdetail/C159171
pins: 1, 2
1 alternate drawing of the same symbol

## RTT25R39JTE
designator R?  Resistance: 390mΩ  (hidden comment: *)
Resistor, 390mΩ, ±5%, 1W, 200V, ±200ppm/℃, -55℃~+155℃, SMD 2512; Manufacturer: Uniroyal; Manufacturer Part Number: RTT25R39JTE; Supplier 1: LCSC; Supplier Part Number 1: C159158; JLCPCB Part Number: C159158; Power Rating: 1W; Category: Resistors; Package Size: 2512; JLCPCB Basic Part: Yes; Tolerance: ±5%; Voltage Rating: 200V; Temperature Coefficient: ±200ppm/℃; Temperature Rating: -55℃~+155℃; ComponentLink1Description: Datasheet; ComponentLink1URL: https://wmsc.lcsc.com/wmsc/upload/file/pdf/v2/lcsc/2304140030_RALEC-RTT25R39JTE_C159158.pdf; ComponentLink2Description: JLCPCB Part URL; ComponentLink2URL: https://jlcpcb.com/partdetail/C159158
pins: 1, 2
1 alternate drawing of the same symbol

## RTT25R047FTE
designator R?  Resistance: 47mΩ  (hidden comment: *)
Resistor, 47mΩ, ±1%, 1W, 200V, ±900ppm/℃, -55℃~+155℃, SMD 2512; Manufacturer: Uniroyal; Manufacturer Part Number: RTT25R047FTE; Supplier 1: LCSC; Supplier Part Number 1: C333700; JLCPCB Part Number: C333700; Power Rating: 1W; Category: Resistors; Package Size: 2512; JLCPCB Basic Part: Yes; Tolerance: ±1%; Voltage Rating: 200V; Temperature Coefficient: ±900ppm/℃; Temperature Rating: -55℃~+155℃; ComponentLink1Description: Datasheet; ComponentLink1URL: https://wmsc.lcsc.com/wmsc/upload/file/pdf/v2/lcsc/2304140030_RALEC-RTT25R047FTE_C333700.pdf; ComponentLink2Description: JLCPCB Part URL; ComponentLink2URL: https://jlcpcb.com/partdetail/C333700
pins: 1, 2
1 alternate drawing of the same symbol

## RTT25R047JTE
designator R?  Resistance: 47mΩ  (hidden comment: *)
Resistor, 47mΩ, ±5%, 1W, 200V, ±900ppm/℃, -55℃~+155℃, SMD 2512; Manufacturer: Uniroyal; Manufacturer Part Number: RTT25R047JTE; Supplier 1: LCSC; Supplier Part Number 1: C159170; JLCPCB Part Number: C159170; Power Rating: 1W; Category: Resistors; Package Size: 2512; JLCPCB Basic Part: Yes; Tolerance: ±5%; Voltage Rating: 200V; Temperature Coefficient: ±900ppm/℃; Temperature Rating: -55℃~+155℃; ComponentLink1Description: Datasheet; ComponentLink1URL: https://wmsc.lcsc.com/wmsc/upload/file/pdf/v2/lcsc/2304140030_RALEC-RTT25R047JTE_C159170.pdf; ComponentLink2Description: JLCPCB Part URL; ComponentLink2URL: https://jlcpcb.com/partdetail/C159170
pins: 1, 2
1 alternate drawing of the same symbol

## RTT25R050FTE
designator R?  Resistance: 50mΩ  (hidden comment: *)
Resistor, 50mΩ, ±1%, 1W, 200V, ±500ppm/℃, -55℃~+155℃, SMD 2512; Manufacturer: Uniroyal; Manufacturer Part Number: RTT25R050FTE; Supplier 1: LCSC; Supplier Part Number 1: C305115; JLCPCB Part Number: C305115; Power Rating: 1W; Category: Resistors; Package Size: 2512; JLCPCB Basic Part: Yes; Tolerance: ±1%; Voltage Rating: 200V; Temperature Coefficient: ±500ppm/℃; Temperature Rating: -55℃~+155℃; ComponentLink1Description: Datasheet; ComponentLink1URL: https://wmsc.lcsc.com/wmsc/upload/file/pdf/v2/lcsc/2304140030_RALEC-RTT25R050FTE_C305115.pdf; ComponentLink2Description: JLCPCB Part URL; ComponentLink2URL: https://jlcpcb.com/partdetail/C305115
pins: 1, 2
1 alternate drawing of the same symbol

## RTT25R50JTE
designator R?  Resistance: 500mΩ  (hidden comment: *)
Resistor, 500mΩ, ±5%, 1W, 200V, ±200ppm/℃, -55℃~+155℃, SMD 2512; Manufacturer: Uniroyal; Manufacturer Part Number: RTT25R50JTE; Supplier 1: LCSC; Supplier Part Number 1: C159156; JLCPCB Part Number: C159156; Power Rating: 1W; Category: Resistors; Package Size: 2512; JLCPCB Basic Part: Yes; Tolerance: ±5%; Voltage Rating: 200V; Temperature Coefficient: ±200ppm/℃; Temperature Rating: -55℃~+155℃; ComponentLink1Description: Datasheet; ComponentLink1URL: https://wmsc.lcsc.com/wmsc/upload/file/pdf/v2/lcsc/2304140030_RALEC-RTT25R50JTE_C159156.pdf; ComponentLink2Description: JLCPCB Part URL; ComponentLink2URL: https://jlcpcb.com/partdetail/C159156
pins: 1, 2
1 alternate drawing of the same symbol
